# Altium footprint library RFConnectors.PcbLib: 19 footprints (part 1 of 2)
Each footprint in its own frame and in the unit in brackets; x right, y up, seen from the top. Pads: shape width x height; smd on the part's side, far side on the other; paste and mask are expansions set on the pad; w line width, h text height; cw(c..) or ccw(c..) is an arc to the next point about the centre after c.
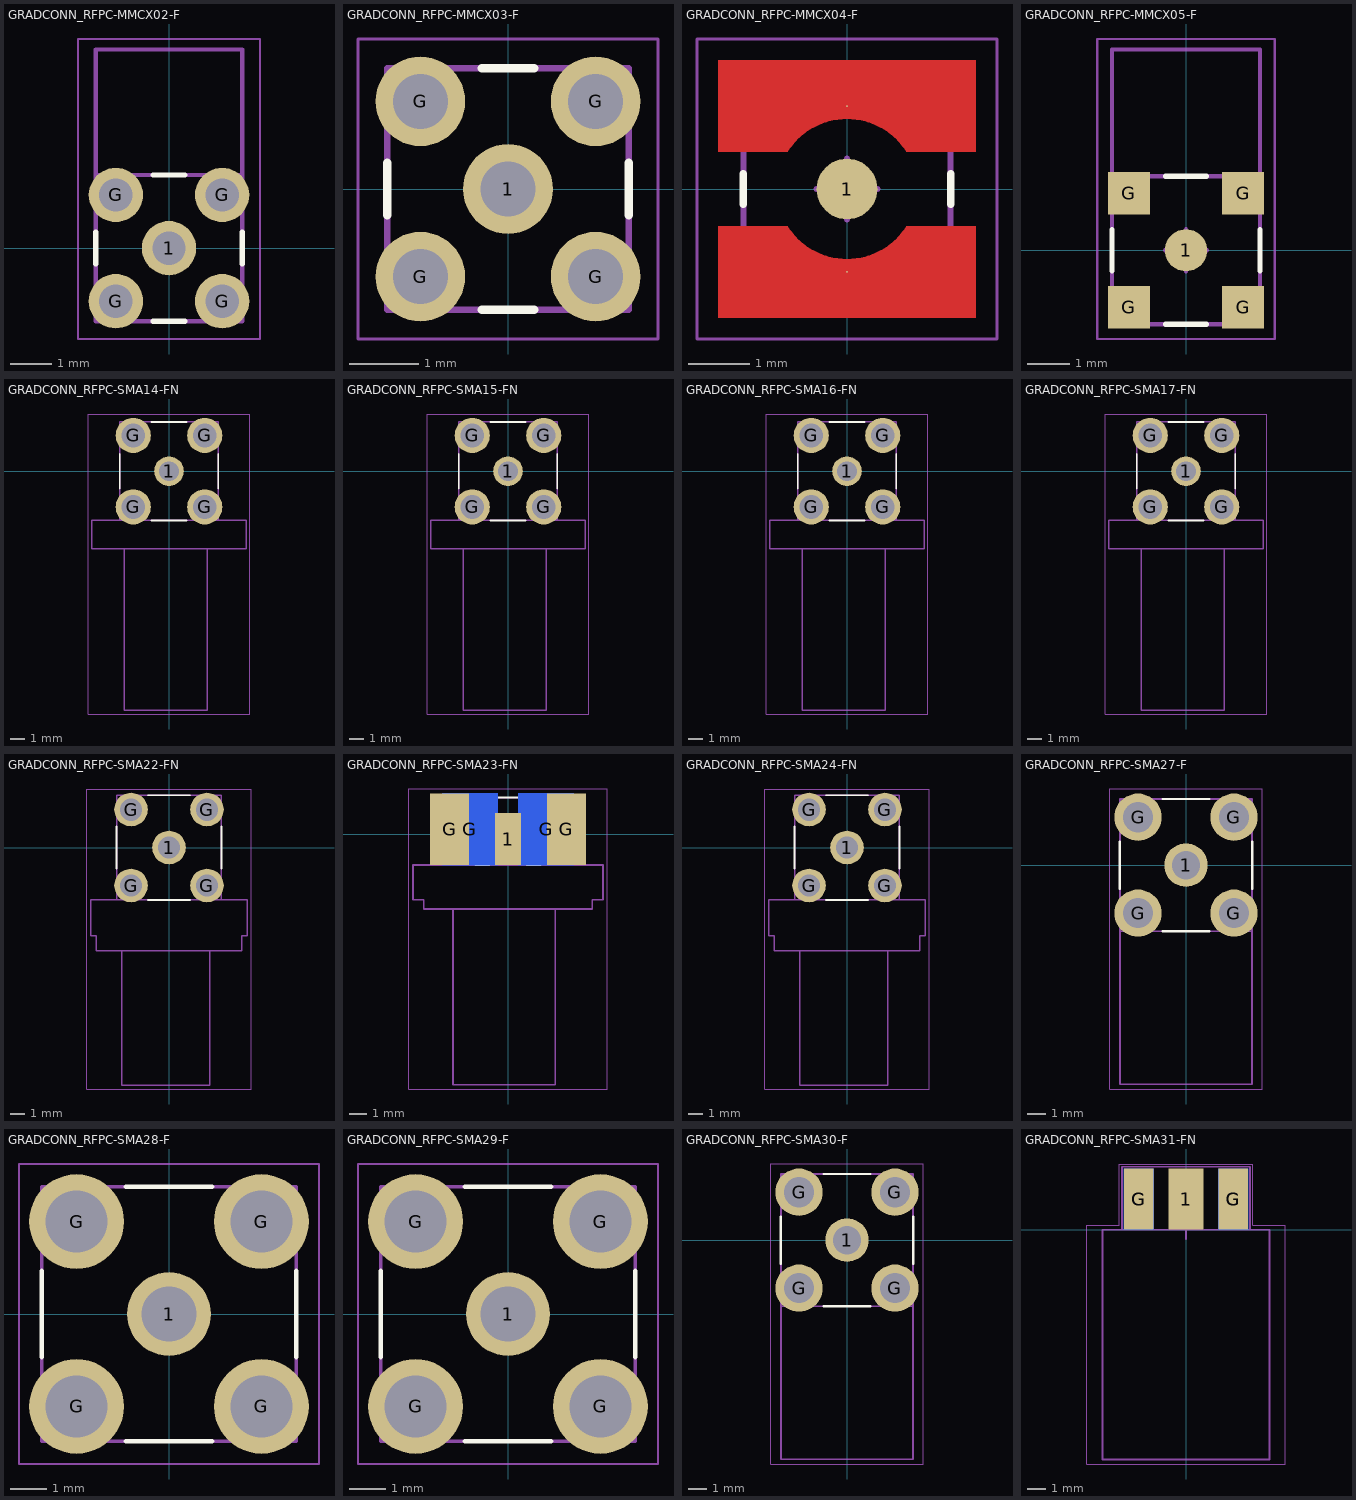
[diagram p0: the footprints below, top view; thin cyan lines are the x and y axes]

## GRADCONN_RFPC-MMCX02-F [mm]
height 3.8
pads (5):
  round 1.3 hole 0.8 mask+0.07: 1(0,0) G(-1.27,-1.27) G(-1.27,1.27) G(1.27,-1.27) G(1.27,1.27)
Top Overlay:
  lines w0.127: -1.75,-0.377 -1.75,0.377 ; -0.377,-1.75 0.377,-1.75 ; -0.377,1.75 0.377,1.75 ; 1.75,-0.377 1.75,0.377
Top Assembly:
  lines w0.1: -1.75,-1.75 -1.75,1.75 1.75,1.75 1.75,-1.75 -1.75,-1.75
  text ".Designator" at -1.578,-0.158 h0.7
Top Courtyard:
  lines w0.05: -2.174,-2.174 2.174,-2.174 2.174,5 -2.174,5 -2.174,-2.174
  lines w0.1: -0.5,0 0.5,0 ; 0,-0.5 0,0.5
Assembly Notes:
  lines w0.1: -1.75,1.75 -1.75,4.75 1.75,4.75 1.75,1.75
3D body "RFPC-MMCX02-F--3DModel-STEP-510211.STEP": height 3.8, standoff -3, extent -1.75,-1.75 1.75,4.75

## GRADCONN_RFPC-MMCX03-F [mm]
height 8.9
pads (5):
  round 1.3 hole 0.8 mask+0.07: 1(0,0) G(-1.27,-1.27) G(-1.27,1.27) G(1.27,-1.27) G(1.27,1.27)
Top Overlay:
  lines w0.127: -1.75,-0.377 -1.75,0.377 ; -0.377,-1.75 0.377,-1.75 ; -0.377,1.75 0.377,1.75 ; 1.75,-0.377 1.75,0.377
Top Assembly:
  lines w0.1: -1.75,-1.75 1.75,-1.75 1.75,1.75 -1.75,1.75 -1.75,-1.75
  text ".Designator" at -1.578,-0.158 h0.7
Top Courtyard:
  lines w0.05: -2.174,-2.174 -2.174,2.174 2.174,2.174 2.174,-2.174 -2.174,-2.174
  lines w0.1: -0.5,0 0.5,0 ; 0,-0.5 0,0.5
3D body "RFPC-MMCX03-F--3DModel-STEP-510211.STEP": height 4.5, standoff -3, extent -1.75,-1.75 1.75,1.75

## GRADCONN_RFPC-MMCX04-F [mm]
height 9.3
pads (3):
  round 1 smd mask+0.07: 1(0,0)
  round 0.025 smd mask+0.07: G(0,-1.36) G(0,1.36)
Top Layer:
  region: 2.11,0.61 0.975,0.61 0.954,0.642 0.932,0.674 0.909,0.705 0.884,0.735 0.859,0.765 0.833,0.793 0.806,0.821 0.777,0.847 0.748,0.873 0.719,0.898 0.688,0.922 0.656,0.944 0.624,0.966 0.591,0.986 0.558,1.006 0.523,1.024 0.488,1.041 0.453,1.057 0.417,1.072 0.381,1.085 0.344,1.097 0.307,1.108 0.269,1.118 0.231,1.127 0.193,1.134 0.155,1.14 0.116,1.144 0.078,1.147 0.039,1.149 0,1.15 -0.039,1.149 -0.078,1.147 -0.116,1.144 -0.155,1.14 -0.193,1.134 -0.231,1.127 -0.269,1.118 -0.307,1.108 -0.344,1.097 -0.381,1.085 -0.417,1.072 -0.453,1.057 -0.488,1.041 -0.523,1.024 -0.558,1.006 -0.591,0.986 -0.624,0.966 -0.656,0.944 -0.688,0.922 -0.719,0.898 -0.748,0.873 -0.777,0.847 -0.806,0.821 -0.833,0.793 -0.859,0.765 -0.884,0.735 -0.909,0.705 -0.932,0.674 -0.954,0.642 -0.975,0.61 -2.11,0.61 -2.11,2.11 2.11,2.11
  region: 2.11,-2.11 -2.11,-2.11 -2.11,-0.61 -0.975,-0.61 -0.954,-0.642 -0.932,-0.674 -0.909,-0.705 -0.884,-0.735 -0.859,-0.765 -0.833,-0.793 -0.806,-0.821 -0.777,-0.847 -0.748,-0.873 -0.719,-0.898 -0.688,-0.922 -0.656,-0.944 -0.624,-0.966 -0.591,-0.986 -0.558,-1.006 -0.523,-1.024 -0.488,-1.041 -0.453,-1.057 -0.417,-1.072 -0.381,-1.085 -0.344,-1.097 -0.307,-1.108 -0.269,-1.118 -0.231,-1.127 -0.193,-1.134 -0.155,-1.14 -0.116,-1.144 -0.078,-1.147 -0.039,-1.149 0,-1.15 0.039,-1.149 0.078,-1.147 0.116,-1.144 0.155,-1.14 0.193,-1.134 0.231,-1.127 0.269,-1.118 0.307,-1.108 0.344,-1.097 0.381,-1.085 0.417,-1.072 0.453,-1.057 0.488,-1.041 0.523,-1.024 0.558,-1.006 0.591,-0.986 0.624,-0.966 0.656,-0.944 0.688,-0.922 0.719,-0.898 0.748,-0.873 0.777,-0.847 0.806,-0.821 0.833,-0.793 0.859,-0.765 0.884,-0.735 0.909,-0.705 0.932,-0.674 0.954,-0.642 0.975,-0.61 2.11,-0.61
Top Overlay:
  lines w0.127: -1.7,-0.246 -1.7,0.246 ; 1.7,-0.246 1.7,0.246
Top Assembly:
  lines w0.1: -1.7,-1.7 -1.7,1.7 1.7,1.7 1.7,-1.7 -1.7,-1.7
  text ".Designator" at -1.578,-0.158 h0.7
Top Courtyard:
  lines w0.05: -2.46,-2.46 -2.46,2.46 2.46,2.46 2.46,-2.46 -2.46,-2.46
  lines w0.1: -0.5,0 0.5,0 ; 0,-0.5 0,0.5
3D body "RFPC-MMCX04-F--3DModel-STEP-510211.STEP": height 5, standoff 0, extent -1.7,-1.7 1.7,1.7

## GRADCONN_RFPC-MMCX05-F [mm]
height 3.8
pads (5):
  round 1 smd mask+0.07: 1(0,0)
  rect 1x1 smd mask+0.07: G(-1.35,-1.35) G(-1.35,1.35) G(1.35,-1.35) G(1.35,1.35)
Top Overlay:
  lines w0.127: -1.75,-0.487 -1.75,0.487 ; -0.487,-1.75 0.487,-1.75 ; -0.487,1.75 0.487,1.75 ; 1.75,-0.487 1.75,0.487
Top Assembly:
  lines w0.1: -1.75,-1.75 1.75,-1.75 1.75,1.75 -1.75,1.75 -1.75,-1.75
  text ".Designator" at -1.578,-0.158 h0.7
Top Courtyard:
  lines w0.05: -2.1,-2.1 2.1,-2.1 2.1,5 -2.1,5 -2.1,-2.1
  lines w0.1: -0.5,0 0.5,0 ; 0,-0.5 0,0.5
Assembly Notes:
  lines w0.1: -1.75,1.75 -1.75,4.75 1.75,4.75 1.75,1.75
3D body "step_temp.STEP": height 4.5, standoff 0, extent -1.75,-1.75 1.75,4.75

## GRADCONN_RFPC-SMA14-FN [mm]
height 12.44
pads (5):
  round 2.1 hole 1.4 mask+0.07: 1(0,0)
  round 2.5 hole 1.7 mask+0.07: G(-2.54,-2.54) G(-2.54,2.54) G(2.54,-2.54) G(2.54,2.54)
Top Overlay:
  lines w0.127: -3.5,-1.243 -3.5,1.243 ; -1.243,-3.5 1.243,-3.5 ; -1.243,3.5 1.243,3.5 ; 3.5,-1.243 3.5,1.243
Top Assembly:
  lines w0.1: -3.5,-3.5 -3.5,3.5 3.5,3.5 3.5,-3.5 -3.5,-3.5
  text ".Designator" at -1.578,-0.158 h0.7
Top Courtyard:
  lines w0.05: -5.75,-17.25 -5.75,4.065 5.75,4.065 5.75,-17.25 -5.75,-17.25
  lines w0.1: -0.5,0 0.5,0 ; 0,-0.5 0,0.5
Assembly Notes:
  lines w0.1: -3.175,-5.5 -3.175,-17 2.725,-17 2.725,-5.5 ; -5.5,-5.5 -5.5,-3.5 5.5,-3.5 5.5,-5.5 -5.5,-5.5
3D body "RFPC-SMA14-FN-A--3DModel-STEP-510211.STEP": height 12.41, standoff -3.96, extent -5.5,-16.9 5.5,3.5

## GRADCONN_RFPC-SMA15-FN [mm]
height 12.44
pads (5):
  round 2.1 hole 1.4 mask+0.07: 1(0,0)
  round 2.5 hole 1.7 mask+0.07: G(-2.54,-2.54) G(-2.54,2.54) G(2.54,-2.54) G(2.54,2.54)
Top Overlay:
  lines w0.127: -3.5,-1.243 -3.5,1.243 ; -1.243,-3.5 1.243,-3.5 ; -1.243,3.5 1.243,3.5 ; 3.5,-1.243 3.5,1.243
Top Assembly:
  lines w0.1: -3.5,-3.5 3.5,-3.5 3.5,3.5 -3.5,3.5 -3.5,-3.5
  text ".Designator" at -1.578,-0.158 h0.7
Top Courtyard:
  lines w0.05: -5.75,-17.25 -5.75,4.065 5.75,4.065 5.75,-17.25 -5.75,-17.25
  lines w0.1: -0.5,0 0.5,0 ; 0,-0.5 0,0.5
Assembly Notes:
  lines w0.1: -3.175,-5.5 -3.175,-17 2.725,-17 2.725,-5.5 ; -5.5,-5.5 -5.5,-3.5 5.5,-3.5 5.5,-5.5 -5.5,-5.5
3D body "RFPC-SMA15-FN--3DModel-STEP-510211.STEP": height 12.41, standoff -3.96, extent -5.5,-16.97 5.5,3.5

## GRADCONN_RFPC-SMA16-FN [mm]
height 14.86
pads (5):
  round 2.1 hole 1.4 mask+0.07: 1(0,0)
  round 2.5 hole 1.7 mask+0.07: G(-2.54,-2.54) G(-2.54,2.54) G(2.54,-2.54) G(2.54,2.54)
Top Overlay:
  lines w0.127: -3.5,-1.243 -3.5,1.243 ; -1.243,-3.5 1.243,-3.5 ; -1.243,3.5 1.243,3.5 ; 3.5,-1.243 3.5,1.243
Top Assembly:
  lines w0.1: -3.5,-3.5 -3.5,3.5 3.5,3.5 3.5,-3.5 -3.5,-3.5
  text ".Designator" at -1.578,-0.158 h0.7
Top Courtyard:
  lines w0.05: -5.75,-17.25 5.75,-17.25 5.75,4.065 -5.75,4.065 -5.75,-17.25
  lines w0.1: -0.5,0 0.5,0 ; 0,-0.5 0,0.5
Assembly Notes:
  lines w0.1: -3.175,-5.5 -3.175,-17 2.725,-17 2.725,-5.5 ; -5.5,-5.5 -5.5,-3.5 5.5,-3.5 5.5,-5.5 -5.5,-5.5
3D body "RFPC-SMA16-FN--3DModel-STEP-510211.STEP": height 14.85, standoff -3.95, extent -5.5,-5.52 5.5,5.48

## GRADCONN_RFPC-SMA17-FN [mm]
height 14.86
pads (5):
  round 2.1 hole 1.4 mask+0.07: 1(0,0)
  round 2.5 hole 1.7 mask+0.07: G(-2.54,-2.54) G(-2.54,2.54) G(2.54,-2.54) G(2.54,2.54)
Top Overlay:
  lines w0.127: -3.5,-1.243 -3.5,1.243 ; -1.243,-3.5 1.243,-3.5 ; -1.243,3.5 1.243,3.5 ; 3.5,-1.243 3.5,1.243
Top Assembly:
  lines w0.1: -3.5,-3.5 3.5,-3.5 3.5,3.5 -3.5,3.5 -3.5,-3.5
  text ".Designator" at -1.578,-0.158 h0.7
Top Courtyard:
  lines w0.05: -5.75,-17.25 5.75,-17.25 5.75,4.065 -5.75,4.065 -5.75,-17.25
  lines w0.1: -0.5,0 0.5,0 ; 0,-0.5 0,0.5
Assembly Notes:
  lines w0.1: -3.175,-5.5 -3.175,-17 2.725,-17 2.725,-5.5 ; -5.5,-5.5 5.5,-5.5 5.5,-3.5 -5.5,-3.5 -5.5,-5.5
3D body "step_temp.STEP": height 14.92, standoff -3.95, extent -5.5,-5.48 5.5,5.52

## GRADCONN_RFPC-SMA22-FN [mm]
height 11.4
pads (5):
  round 2.25 hole 1.5 mask+0.07: 1(0,0) G(-2.54,-2.54) G(-2.54,2.54) G(2.54,-2.54) G(2.54,2.54)
Top Overlay:
  lines w0.127: -3.5,-1.402 -3.5,1.402 ; -1.402,-3.5 1.402,-3.5 ; -1.402,3.5 1.402,3.5 ; 3.5,-1.402 3.5,1.402
Top Assembly:
  lines w0.1: -3.5,-3.5 3.5,-3.5 3.5,3.5 -3.5,3.5 -3.5,-3.5
  text ".Designator" at -1.578,-0.158 h0.7
Top Courtyard:
  lines w0.05: -5.5,-16.15 5.5,-16.15 5.5,3.915 -5.5,3.915 -5.5,-16.15
  lines w0.1: -0.5,0 0.5,0 ; 0,-0.5 0,0.5
Assembly Notes:
  lines w0.1: -3.175,-6.9 -3.175,-15.9 2.725,-15.9 2.725,-6.9 ; -5.25,-5.9 -5.25,-3.5 5.25,-3.5 5.25,-5.9 4.85,-5.9 4.85,-6.9 -4.85,-6.9 -4.85,-5.9 -5.25,-5.9
3D body "step_temp.STEP": height 11.64, standoff -3.9, extent -5.25,-15.9 5.25,3.5

## GRADCONN_RFPC-SMA23-FN [mm]
height 6
pads (5):
  rect 1.5x3 smd mask+0.07: 1(0,-0.287)
  rect 2.25x4.15 smd mask+0.07: G(-3.375,0.288) G(3.375,0.288)
  rect 3.2x4.15 smd far side mask+0.07: G(-2.2,0.288) G(2.2,0.288)
Top Overlay:
  lines w0.127: -1.887,-1.787 -1.113,-1.787 ; -1.887,2.113 1.887,2.113 ; 1.113,-1.787 1.887,-1.787
Top Assembly:
  lines w0.1: -3.74,-1.787 -3.74,2.113 3.74,2.113 3.74,-1.787 -3.74,-1.787
  text ".Designator" at -1.578,-0.158 h0.7
Top Courtyard:
  lines w0.05: -5.75,-14.737 -5.75,2.613 5.75,2.613 5.75,-14.737 -5.75,-14.737
  lines w0.1: -0.5,0 0.5,0 ; 0,-0.5 0,0.5
Assembly Notes:
  lines w0.1: -3.175,-4.327 -3.175,-14.487 2.725,-14.487 2.725,-4.327 ; -5.5,-3.787 -5.5,-1.787 5.5,-1.787 5.5,-3.787 4.875,-3.787 4.875,-4.327 -4.875,-4.327 -4.875,-3.787 -5.5,-3.787
3D body "RFPC-SMA23-FN--3DModel-STEP-56544.STEP": height 5.76, standoff -5.24, extent -5.5,-14.5 5.5,2.1

## GRADCONN_RFPC-SMA24-FN [mm]
height 11.4
pads (5):
  round 2.25 hole 1.5 mask+0.07: 1(0,0) G(-2.54,-2.54) G(-2.54,2.54) G(2.54,-2.54) G(2.54,2.54)
Top Overlay:
  lines w0.127: -3.5,-1.402 -3.5,1.402 ; -1.402,-3.5 1.402,-3.5 ; -1.402,3.5 1.402,3.5 ; 3.5,-1.402 3.5,1.402
Top Assembly:
  lines w0.1: -3.5,-3.5 3.5,-3.5 3.5,3.5 -3.5,3.5 -3.5,-3.5
  text ".Designator" at -1.578,-0.158 h0.7
Top Courtyard:
  lines w0.05: -5.5,-16.15 5.5,-16.15 5.5,3.915 -5.5,3.915 -5.5,-16.15
  lines w0.1: -0.5,0 0.5,0 ; 0,-0.5 0,0.5
Assembly Notes:
  lines w0.1: -3.175,-6.9 -3.175,-15.9 2.725,-15.9 2.725,-6.9 ; -5.25,-5.9 -5.25,-3.5 5.25,-3.5 5.25,-5.9 4.85,-5.9 4.85,-6.9 -4.85,-6.9 -4.85,-5.9 -5.25,-5.9
3D body "step_temp.STEP": height 11.65, standoff -3.9, extent -5.25,-15.94 5.25,3.5

## GRADCONN_RFPC-SMA27-F [mm]
height 10
pads (5):
  round 2.3 hole 1.5 mask+0.07: 1(0,0)
  round 2.5 hole 1.6 mask+0.07: G(-2.54,-2.54) G(-2.54,2.54) G(2.54,-2.54) G(2.54,2.54)
Top Overlay:
  lines w0.127: -3.5,-1.243 -3.5,1.243 ; -1.243,-3.5 1.243,-3.5 ; -1.243,3.5 1.243,3.5 ; 3.5,-1.243 3.5,1.243
Top Assembly:
  lines w0.1: -3.5,-3.5 3.5,-3.5 3.5,3.5 -3.5,3.5 -3.5,-3.5
  text ".Designator" at -1.578,-0.158 h0.7
Top Courtyard:
  lines w0.05: -4.03,-11.85 4.03,-11.85 4.03,4.03 -4.03,4.03 -4.03,-11.85
  lines w0.1: -0.5,0 0.5,0 ; 0,-0.5 0,0.5
Assembly Notes:
  lines w0.1: -3.5,-3.5 -3.5,-11.6 3.5,-11.6 3.5,-3.5
3D body "RFPC-SMA27-F--3DModel-STEP-269445.STEP": height 10, standoff -4, extent -3.5,-11.6 3.5,3.5

## GRADCONN_RFPC-SMA28-F [mm]
height 9.8
pads (5):
  round 2.3 hole 1.5 mask+0.07: 1(0,0)
  round 2.6 hole 1.7 mask+0.07: G(-2.54,-2.54) G(-2.54,2.54) G(2.54,-2.54) G(2.54,2.54)
Top Overlay:
  lines w0.127: -3.5,-1.181 -3.5,1.181 ; -1.181,-3.5 1.181,-3.5 ; -1.181,3.5 1.181,3.5 ; 3.5,-1.181 3.5,1.181
Top Assembly:
  lines w0.1: -3.5,-3.5 -3.5,3.5 3.5,3.5 3.5,-3.5 -3.5,-3.5
  text ".Designator" at -1.578,-0.158 h0.7
Top Courtyard:
  lines w0.05: -4.12,-4.12 -4.12,4.12 4.12,4.12 4.12,-4.12 -4.12,-4.12
  lines w0.1: -0.5,0 0.5,0 ; 0,-0.5 0,0.5
3D body "RFPC-SMA28-F--3DModel-STEP-740395.STEP": height 9.6, standoff -3.9, extent -3.5,-3.5 3.5,3.5

## GRADCONN_RFPC-SMA29-F [mm]
height 9.8
pads (5):
  round 2.3 hole 1.5 mask+0.07: 1(0,0)
  round 2.6 hole 1.7 mask+0.07: G(-2.54,-2.54) G(-2.54,2.54) G(2.54,-2.54) G(2.54,2.54)
Top Overlay:
  lines w0.127: -3.5,-1.181 -3.5,1.181 ; -1.181,-3.5 1.181,-3.5 ; -1.181,3.5 1.181,3.5 ; 3.5,-1.181 3.5,1.181
Top Assembly:
  lines w0.1: -3.5,-3.5 -3.5,3.5 3.5,3.5 3.5,-3.5 -3.5,-3.5
  text ".Designator" at -1.578,-0.158 h0.7
Top Courtyard:
  lines w0.05: -4.12,-4.12 -4.12,4.12 4.12,4.12 4.12,-4.12 -4.12,-4.12
  lines w0.1: -0.5,0 0.5,0 ; 0,-0.5 0,0.5
3D body "step_temp.STEP": height 9.77, standoff -3.9, extent -3.5,-3.5 3.5,3.5

## GRADCONN_RFPC-SMA30-F [mm]
height 10.3
pads (5):
  round 2.3 hole 1.5 mask+0.07: 1(0,0)
  round 2.5 hole 1.6 mask+0.07: G(-2.54,-2.54) G(-2.54,2.54) G(2.54,-2.54) G(2.54,2.54)
Top Overlay:
  lines w0.127: -3.5,-1.243 -3.5,1.243 ; -1.243,-3.5 1.243,-3.5 ; -1.243,3.5 1.243,3.5 ; 3.5,-1.243 3.5,1.243
Top Assembly:
  lines w0.1: -3.5,-3.5 -3.5,3.5 3.5,3.5 3.5,-3.5 -3.5,-3.5
  text ".Designator" at -1.578,-0.158 h0.7
Top Courtyard:
  lines w0.05: -4.03,-11.85 -4.03,4.03 4.03,4.03 4.03,-11.85 -4.03,-11.85
  lines w0.1: -0.5,0 0.5,0 ; 0,-0.5 0,0.5
Assembly Notes:
  lines w0.1: -3.5,-3.5 -3.5,-11.6 3.5,-11.6 3.5,-3.5
3D body "RFPC-SMA30-F--3DModel-STEP-56544.STEP": height 10.1, standoff -3.7, extent -3.5,-11.7 3.5,3.5

## GRADCONN_RFPC-SMA31-FN [mm]
height 9
pads (5):
  rect 1.87x3.3 smd mask+0.07: 1(0,1.65)
  rect 1.6x3.3 smd mask+0.07: G(-2.55,1.65) G(2.55,1.65)
  rect 1.6x3.3 smd far side mask+0.07: G(-2.55,1.65) G(2.55,1.65)
Top Assembly:
  lines w0.1: -3.45,0 3.45,0 3.45,3.4 -3.45,3.4 -3.45,0
  text ".Designator" at -1.578,1.542 h0.7
Top Courtyard:
  lines w0.05: -5.35,-12.65 -5.35,0.25 -3.6,0.25 -3.6,3.55 3.6,3.55 3.6,0.25 5.35,0.25 5.35,-12.65 -5.35,-12.65
  lines w0.1: -0.5,0 0.5,0 ; 0,-0.5 0,0.5
Assembly Notes:
  lines w0.1: -4.5,-12.4 4.5,-12.4 4.5,0 -4.5,0 -4.5,-12.4
3D body "RFPC-SMA31-FN-095-A_1.0.STEP": height 5.71, standoff -4.48, extent -5.096,-12.4 5.101,2.8